# Altium footprint library UP-ROBOT Devices(2013-02-26).PcbLib: 150 footprints (part 5 of 10)
Each footprint in its own frame and in the unit in brackets; x right, y up, seen from the top. Pads: shape width x height; smd on the part's side, far side on the other; paste and mask are expansions set on the pad; w line width, h text height; cw(c..) or ccw(c..) is an arc to the next point about the centre after c.
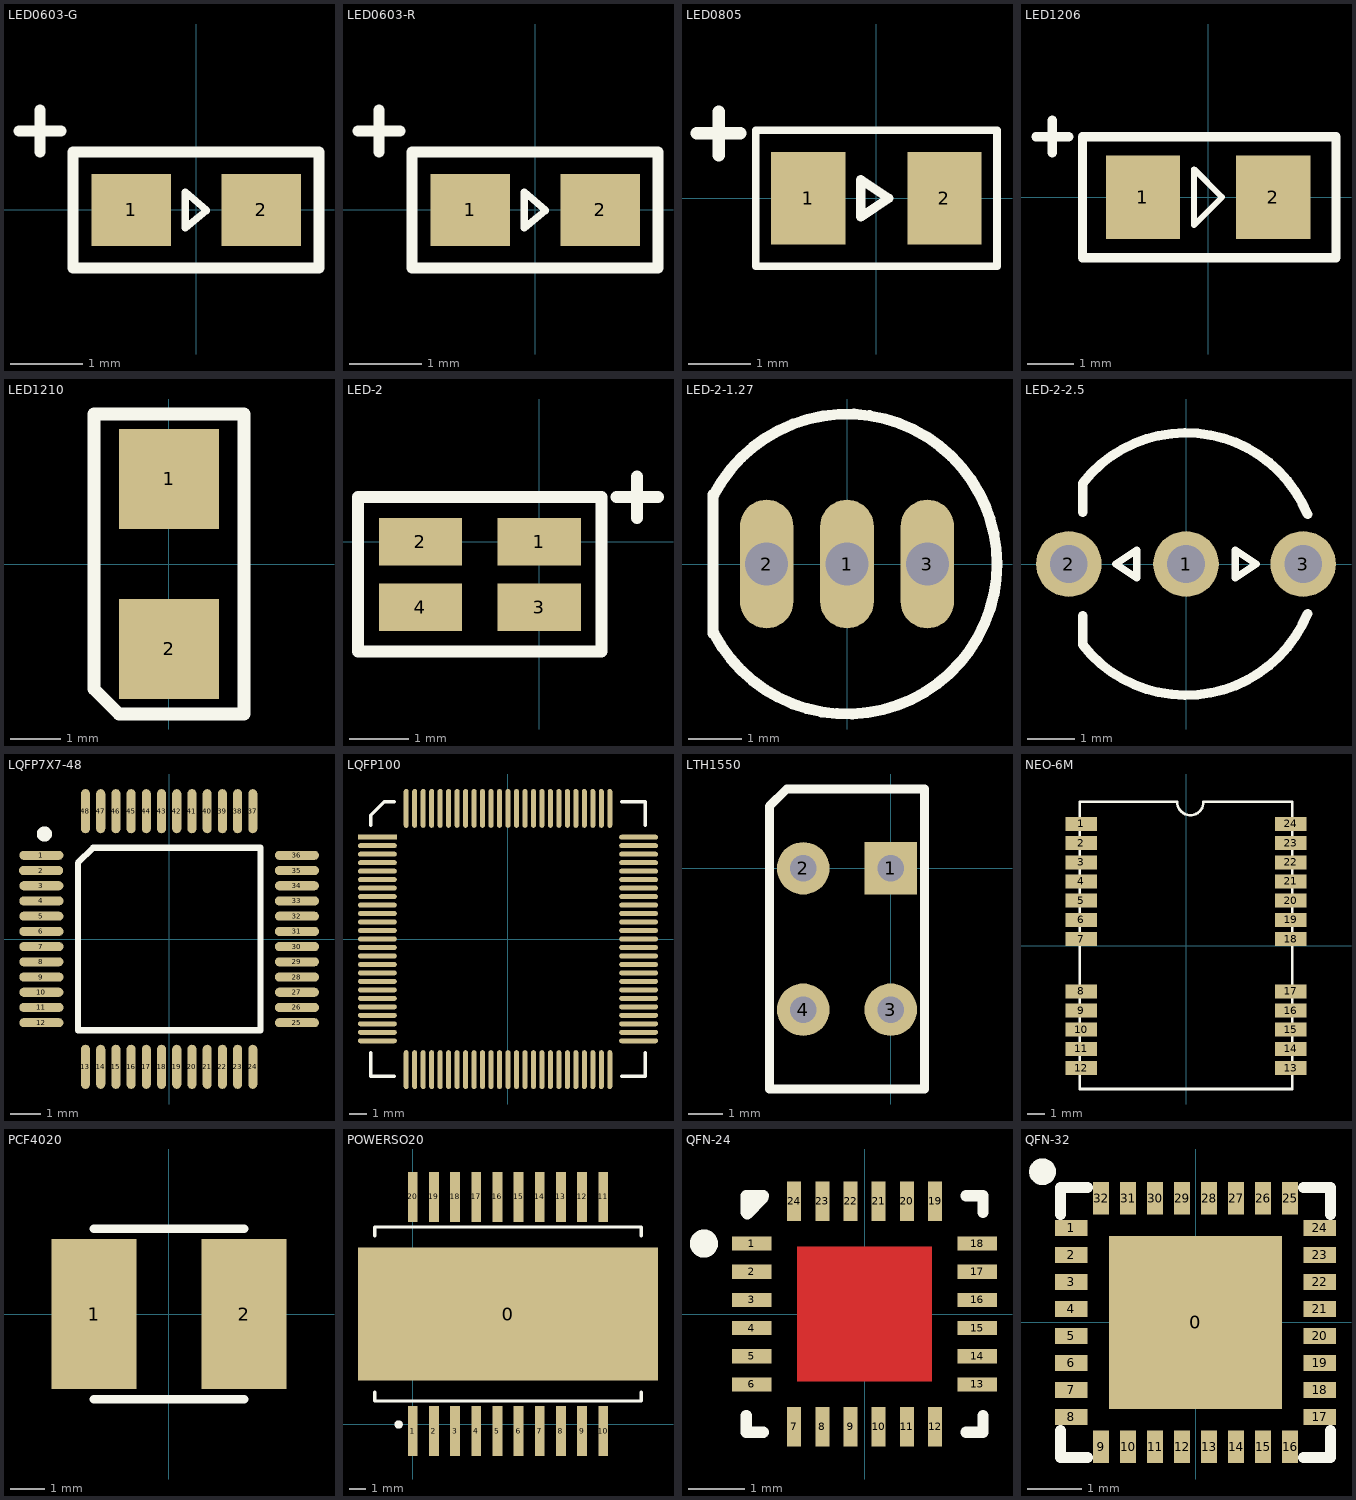
[diagram p4: the footprints below, top view; thin cyan lines are the x and y axes]

## LED0603-G [mm]
pads (2):
  rect 1.1x1 smd: 1(-0.9,0) 2(0.9,0)
Top Overlay:
  lines w0.1: 0.14,-0.01 -0.15,-0.25 -0.15,0.25 0.14,0
  lines w0.152: -2.45,1.09 -1.87,1.09 ; -2.16,0.8 -2.16,1.38 ; -1.7,-0.8 -1.7,0.8 0.153,0.8 1.7,0.8 1.7,-0.8 -1.7,-0.8
3D body: height 0.9, standoff 0, extent -0.85,-0.45 0.85,0.45

## LED0603-R [mm]
pads (2):
  rect 1.1x1 smd: 1(-0.9,0) 2(0.9,0)
Top Overlay:
  lines w0.1: 0.14,-0.01 -0.15,-0.25 -0.15,0.25 0.14,0
  lines w0.152: -2.45,1.09 -1.87,1.09 ; -2.16,0.8 -2.16,1.38 ; -1.7,-0.8 1.7,-0.8 1.7,0.8 0.153,0.8 -1.7,0.8 -1.7,-0.8
3D body: height 0.9, standoff 0, extent -0.85,-0.45 0.85,0.45

## LED0805 [mm]
height 3.6
pads (2):
  rect 1.2x1.5 smd: 1(-1.1,0) 2(1.1,0)
Top Overlay:
  lines w0.127: -1.95,-1.1 1.95,-1.1 1.95,1.1 -1.95,1.1 -1.95,-1.1
  lines w0.152: -0.25,-0.3 -0.25,0 -0.25,0.3 0.2,0 -0.25,-0.3
  lines w0.203: -2.9,1.05 -2.55,1.05 ; -2.55,0.7 -2.55,1.05 ; -2.55,1.4 -2.55,1.05 ; -2.2,1.05 -2.55,1.05
3D body: height 0.56, standoff 0, extent -1.016,-0.64 1.016,0.635

## LED1206 [mm]
pads (2):
  rect 1.6x1.8 smd: 1(-1.4,0) 2(1.4,0)
Top Overlay:
  lines w0.127: -0.3,-0.6 0.3,0 -0.3,0.6 -0.3,-0.6
  lines w0.203: -3.7,1.3 -3.35,1.3 ; -3.35,0.95 -3.35,1.3 ; -3.35,1.65 -3.35,1.3 ; -3,1.3 -3.35,1.3 ; -2.7,-1.3 -2.7,1.3 2.75,1.3 2.75,-1.3 -2.7,-1.3
3D body: height 1.05, standoff 0, extent -1.6,-0.851 1.6,0.749

## LED1210 [mm]
pads (2):
  rect 2x2 smd: 1(0,1.7) 2(0,-1.7)
Top Overlay:
  lines w0.254: -1.5,-2.5 -1.5,3 1.5,3 1.5,-3 -1,-3 -1.5,-2.5
3D body: height 1.8, standoff 0, extent -1.41,-1.83 1.4,1.79

## LED-2 [mm]
height 6.34
pads (4):
  rect 1.4x0.8 smd: 1(0,0) 2(-2,0) 3(0,-1.1) 4(-2,-1.1)
Top Overlay:
  lines w0.203: 1.3,0.75 1.65,0.75 ; 1.65,0.4 1.65,0.75 ; 1.65,1.1 1.65,0.75 ; 2,0.75 1.65,0.75 ; -3.05,-1.85 1.05,-1.85 1.05,-1.75 1.05,0.75 -1,0.75 -3.05,0.75 -3.05,0.7 -3.05,-1.85

## LED-2-1.27 [mm]
height 12.7
pads (3):
  oval 1x2.4 hole 0.8: 1(0,0) 2(-1.5,0) 3(1.5,0)
Top Overlay:
  lines w0.203: -2.5,-1.3 -2.5,1.3 ; -2.484,-1.292 ccw(c0,0) 2.568,1.116 ; -2.484,1.292 cw(c0,0) 2.593,1.056
3D body: height 9.6, standoff -3.2, extent -2.4,-2.4 2.355,2.24

## LED-2-2.5 [mm]
height 12.7
pads (3):
  round 1.4 hole 0.8: 1(0,0) 2(-2.5,0) 3(2.5,0)
Top Overlay:
  lines w0.152: -1.5,0 -1.05,0.3 -1.05,0 -1.05,-0.3 -1.5,0 ; 1.05,-0.3 1.05,0 1.05,0.3 1.5,0 1.05,-0.3
  lines w0.203: -2.205,-1.726 ccw(c0,0) 2.593,-1.056 ; -2.205,1.726 cw(c0,0) 2.593,1.056 ; -2.2,-1.7 -2.2,-1.1 ; -2.2,1.1 -2.2,1.7
3D body: height 9.6, standoff -3.2, extent -2.4,-2.4 2.355,2.24

## LQFP7X7-48 [mm]
pads (48):
  oval 1.45x0.3 smd: 1(-4.2,2.75) 2(-4.21,2.25) 3(-4.2,1.75) 4(-4.2,1.25) 5(-4.2,0.75) 6(-4.2,0.25) 7(-4.2,-0.25) 8(-4.2,-0.75) 9(-4.2,-1.25) 10(-4.2,-1.75) 11(-4.2,-2.25) 12(-4.2,-2.75) 25(4.2,-2.75) 26(4.2,-2.25) 27(4.2,-1.75) 28(4.2,-1.25) 29(4.2,-0.75) 30(4.2,-0.25) 31(4.2,0.25) 32(4.2,0.75) 33(4.2,1.25) 34(4.2,1.75) 35(4.2,2.25) 36(4.2,2.75)
  oval 0.3x1.45 smd: 13(-2.75,-4.2) 14(-2.25,-4.2) 15(-1.75,-4.2) 16(-1.25,-4.2) 17(-0.75,-4.2) 18(-0.25,-4.2) 19(0.25,-4.2) 20(0.75,-4.2) 21(1.25,-4.2) 22(1.75,-4.2) 23(2.25,-4.2) 24(2.75,-4.2) 37(2.75,4.2) 38(2.25,4.2) 39(1.75,4.2) 40(1.25,4.2) 41(0.75,4.2) 42(0.25,4.2) 43(-0.25,4.2) 44(-0.75,4.2) 45(-1.25,4.2) 46(-1.75,4.2) 47(-2.25,4.2) 48(-2.75,4.2)
Top Overlay:
  circle w0.25: c-4.1,3.45 r0.125
  lines w0.203: -3,-3 -3,2.5 -2.5,3 3,3 3,-3 -3,-3
3D body: height 1.75, standoff -0.06, extent -4.5,-4.5 4.5,4.5

## LQFP100 [mil]
pads (100):
  rect 90x11.5 smd: 1(-303.15,236.22)
  oval 90x11.5 smd: 2(-303.15,216.53) 3(-303.15,196.85) 4(-303.15,177.16) 5(-303.15,157.48) 6(-303.15,137.79) 7(-303.15,118.11) 8(-303.15,98.42) 9(-303.15,78.74) 10(-303.15,59.05) 11(-303.15,39.37) 12(-303.15,19.68) 13(-303.15,0) 14(-303.15,-19.68) 15(-303.15,-39.37) 16(-303.15,-59.05) 17(-303.15,-78.74) 18(-303.15,-98.42) 19(-303.15,-118.11) 20(-303.15,-137.79) 21(-303.15,-157.48) 22(-303.15,-177.16) 23(-303.15,-196.85) 24(-303.15,-216.53) 25(-303.15,-236.22) 51(303.15,-236.22) 52(303.15,-216.53) 53(303.15,-196.85) 54(303.15,-177.16) 55(303.15,-157.48) 56(303.15,-137.79) 57(303.15,-118.11) 58(303.15,-98.42) 59(303.15,-78.74) 60(303.15,-59.05) 61(303.15,-39.37) 62(303.15,-19.68) 63(303.15,0) 64(303.15,19.68) 65(303.15,39.37) 66(303.15,59.05) 67(303.15,78.74) 68(303.15,98.42) 69(303.15,118.11) 70(303.15,137.79) 71(303.15,157.48) 72(303.15,177.16) 73(303.15,196.85) 74(303.15,216.53) 75(303.15,236.22)
  oval 11.5x90 smd: 26(-236.22,-303.15) 27(-216.53,-303.15) 28(-196.85,-303.15) 29(-177.16,-303.15) 30(-157.48,-303.15) 31(-137.79,-303.15) 32(-118.11,-303.15) 33(-98.42,-303.15) 34(-78.74,-303.15) 35(-59.05,-303.15) 36(-39.37,-303.15) 37(-19.68,-303.15) 38(0,-303.15) 39(19.69,-303.15) 40(39.37,-303.15) 41(59.06,-303.15) 42(78.74,-303.15) 43(98.43,-303.15) 44(118.11,-303.15) 45(137.8,-303.15) 46(157.48,-303.15) 47(177.17,-303.15) 48(196.85,-303.15) 49(216.54,-303.15) 50(236.22,-303.15) 76(236.22,303.15) 77(216.54,303.15) 78(196.85,303.15) 79(177.17,303.15) 80(157.48,303.15) 81(137.8,303.15) 82(118.11,303.15) 83(98.43,303.15) 84(78.74,303.15) 85(59.06,303.15) 86(39.37,303.15) 87(19.69,303.15) 88(0,303.15) 89(-19.68,303.15) 90(-39.37,303.15) 91(-59.05,303.15) 92(-78.74,303.15) 93(-98.42,303.15) 94(-118.11,303.15) 95(-137.79,303.15) 96(-157.48,303.15) 97(-177.16,303.15) 98(-196.85,303.15) 99(-216.53,303.15) 100(-236.22,303.15)
Top Overlay:
  lines w7.87: -318.9,-263.78 -318.9,-318.9 -263.78,-318.9 ; -318.9,263.78 -318.9,287.4 -287.4,318.9 -263.78,318.9 ; 263.78,-318.9 318.9,-318.9 318.9,-263.78 ; 263.78,318.9 318.9,318.9 318.9,263.78
3D body: height 57.59, standoff -6.19, extent -314.96,-314.96 314.96,314.96

## LTH1550 [mil]
pads (4):
  rect 60x60 hole 30: 1(0,0)
  round 60 hole 30: 2(-100,0) 3(0,-161.42) 4(-100,-161.42)
Top Overlay:
  lines w10: -138.58,-251.97 38.58,-251.97 38.58,90.55 -118.9,90.55 -138.58,70.87 -138.58,-251.97

## NEO-6M [mm]
height 3
pads (24):
  rect 1.8x0.8 smd: 1(-6,7) 2(-6,5.9) 3(-6,4.8) 4(-6,3.7) 5(-6,2.6) 6(-6,1.5) 7(-6,0.4) 8(-6,-2.6) 9(-6,-3.7) 10(-6,-4.8) 11(-6,-5.9) 12(-6,-7) 13(6,-7) 14(6,-5.9) 15(6,-4.8) 16(6,-3.7) 17(6,-2.6) 18(6,0.4) 19(6,1.5) 20(6,2.6) 21(6,3.7) 22(6,4.8) 23(6,5.9) 24(6,7)
Top Overlay:
  lines w0.152: -0.501,8.27 ccw(c0.25,8.25) 1.001,8.27 ; -0.5,8.27 -6.102,8.27 -6.1,-8.2 6.1,-8.2 6.1,8.27 1,8.27

## PCF4020 [mm]
pads (2):
  rect 2.5x4.4 smd: 1(-2.2,0) 2(2.2,0)
Top Overlay:
  lines w0.254: -2.2,-2.5 2.2,-2.5 ; -2.2,2.5 2.2,2.5

## POWERSO20 [mm]
pads (21):
  rect 18x8 smd: 0(5.715,6.625)
  rect 0.6x3 smd: 1(0,-0.4) 2(1.27,-0.4) 3(2.54,-0.4) 4(3.81,-0.4) 5(5.08,-0.4) 6(6.35,-0.4) 7(7.62,-0.4) 8(8.89,-0.4) 9(10.16,-0.4) 10(11.43,-0.4) 11(11.43,13.65) 12(10.16,13.65) 13(8.89,13.65) 14(7.62,13.65) 15(6.35,13.65) 16(5.08,13.65) 17(3.81,13.65) 18(2.54,13.65) 19(1.27,13.65) 20(0,13.65)
Top Overlay:
  circle w0.25: c-0.85,0 r0.125
  lines w0.2: -2.285,1.925 -2.285,1.4 13.715,1.4 13.715,1.925 ; -2.285,11.325 -2.285,11.85 13.715,11.85 13.715,11.325

## QFN-24 [mm]
pads (24):
  rect 0.7x0.25 smd mask+0.05: 1(-2,1.25) 2(-2,0.75) 3(-2,0.25) 4(-2,-0.25) 5(-2,-0.75) 6(-2,-1.25) 13(2,-1.25) 14(2,-0.75) 15(2,-0.25) 16(2,0.25) 17(2,0.75) 18(2,1.25)
  rect 0.25x0.7 smd mask+0.05: 7(-1.25,-2) 8(-0.75,-2) 9(-0.25,-2) 10(0.25,-2) 11(0.75,-2) 12(1.25,-2) 19(1.25,2) 20(0.75,2) 21(0.25,2) 22(-0.25,2) 23(-0.75,2) 24(-1.25,2)
Top Layer:
  rectangle: -1.2,-1.2 1.2,1.2
Top Overlay:
  circle w0.25: c-2.85,1.25 r0.125
  lines w0.2: -2.1,-1.8 -2.1,-2.1 -1.8,-2.1 ; -2.1,1.8 -2.1,2.1 -1.8,2.1 ; -2.083,1.778 -1.803,2.057 -1.803,2.083 ; 1.8,-2.1 2.1,-2.1 2.1,-1.8 ; 1.8,2.1 2.1,2.1 2.1,1.8
Top Paste:
  circle w0.3: c0,0 r0.15
  circle w0.3: c-0.6,0.6 r0.15
  circle w0.3: c0.6,0.6 r0.15
  circle w0.3: c0.6,-0.6 r0.15
  circle w0.3: c-0.6,-0.6 r0.15
Top Solder:
  rectangle: -1.25,-1.25 1.25,1.25
Mechanical 15:
  lines w0.1: -0.5,0 0.5,0 ; 0,-0.5 0,0.5

## QFN-32 [mm]
pads (33):
  rect 3.2x3.2 smd: 0(0,0)
  rect 0.6x0.3 smd: 1(-2.3,1.75) 2(-2.3,1.25) 3(-2.3,0.75) 4(-2.3,0.25) 5(-2.3,-0.25) 6(-2.3,-0.75) 7(-2.3,-1.25) 8(-2.3,-1.75) 17(2.3,-1.75) 18(2.3,-1.25) 19(2.3,-0.75) 20(2.3,-0.25) 21(2.3,0.25) 22(2.3,0.75) 23(2.3,1.25) 24(2.3,1.75)
  rect 0.3x0.6 smd: 9(-1.75,-2.3) 10(-1.25,-2.3) 11(-0.75,-2.3) 12(-0.25,-2.3) 13(0.25,-2.3) 14(0.75,-2.3) 15(1.25,-2.3) 16(1.75,-2.3) 25(1.75,2.3) 26(1.25,2.3) 27(0.75,2.3) 28(0.25,2.3) 29(-0.25,2.3) 30(-0.75,2.3) 31(-1.25,2.3) 32(-1.75,2.3)
Top Overlay:
  circle w0.254: c-2.834,2.792 r0.121
  lines w0.2: -2.5,-2 -2.5,-2.5 -2,-2.5 ; -2.5,2 -2.5,2.5 -2,2.5 ; 2,-2.5 2.5,-2.5 2.5,-2 ; 2,2.5 2.5,2.5 2.5,2
3D body: height 0.8, standoff -0.05, extent -2.502,-2.491 2.498,2.509